# Altium footprint library SAMTEC THD.PcbLib: 161 footprints (part 7 of 12)
Each footprint in its own frame and in the unit in brackets; x right, y up, seen from the top. Pads: shape width x height; smd on the part's side, far side on the other; paste and mask are expansions set on the pad; w line width, h text height; cw(c..) or ccw(c..) is an arc to the next point about the centre after c.
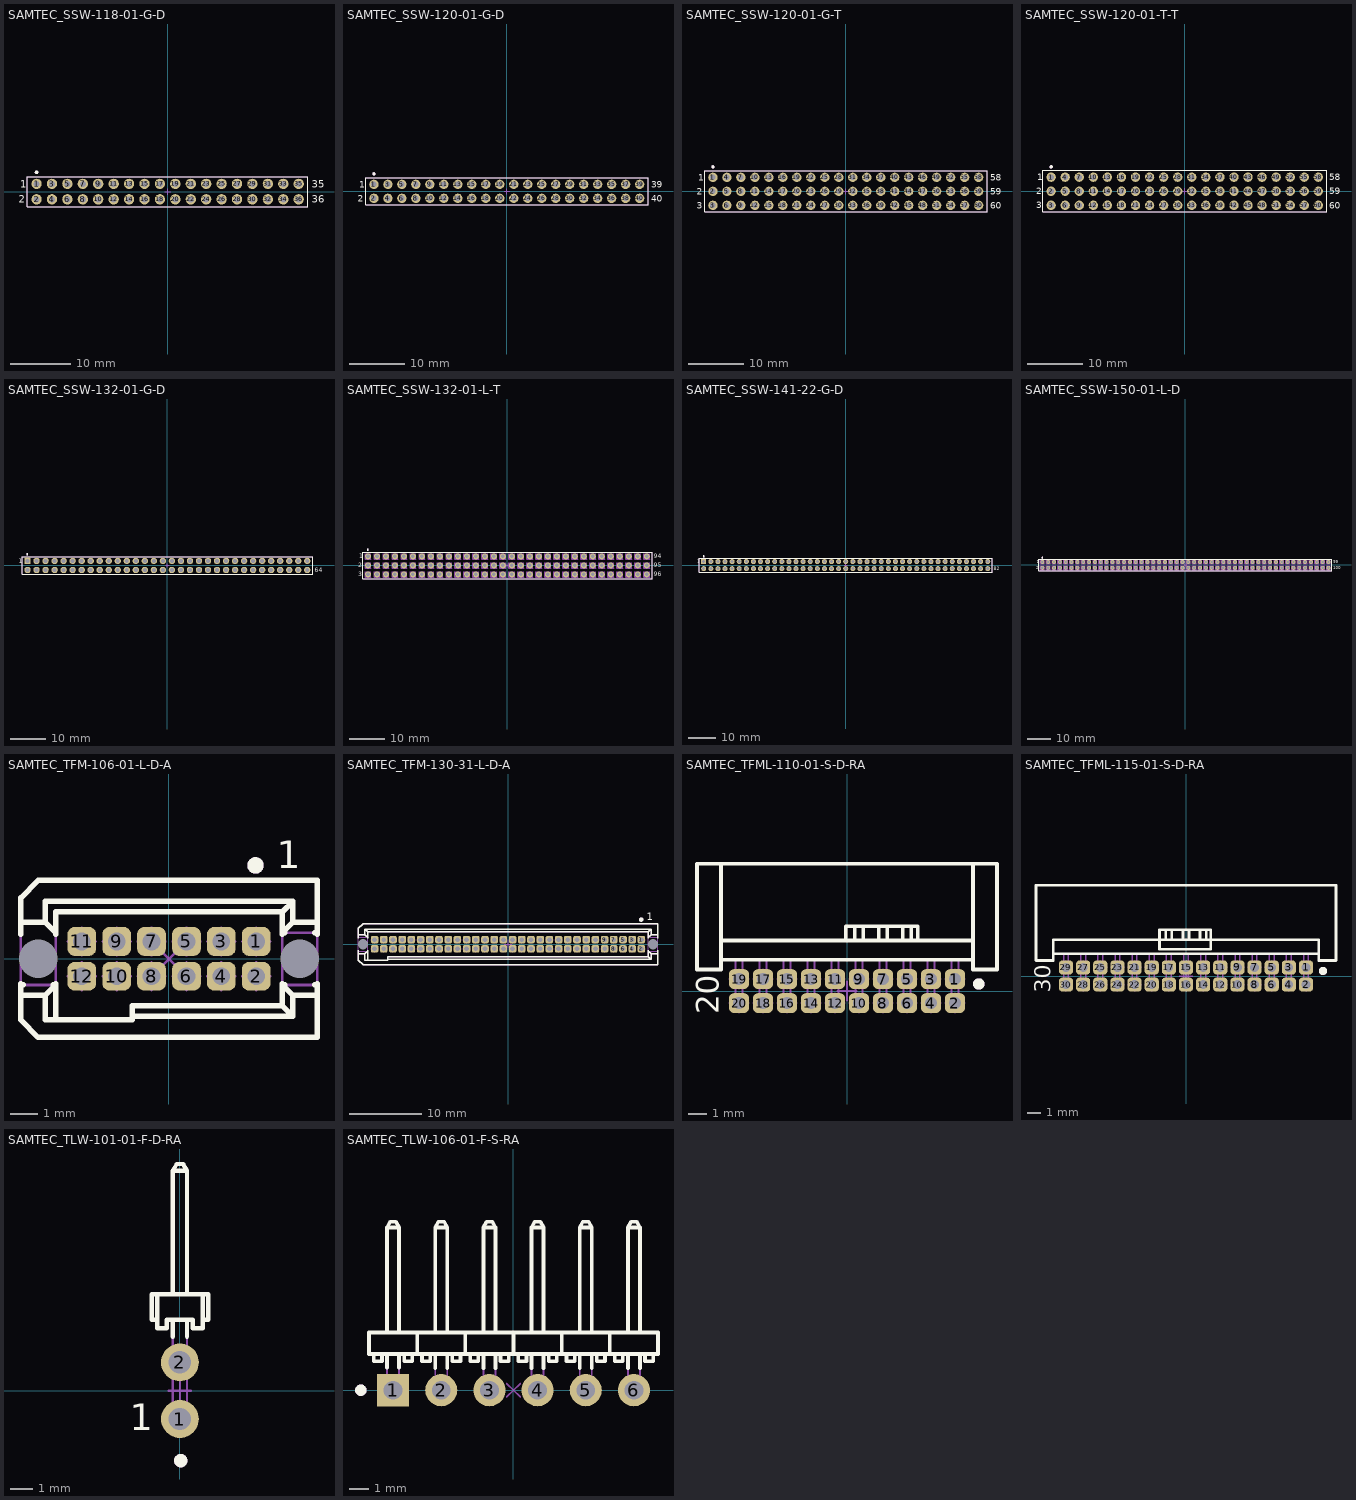
[diagram p6: the footprints below, top view; thin cyan lines are the x and y axes]

## SAMTEC_SSW-118-01-G-D [mm] "36 Contacts, Pitch 2.54mm, Double Row Through Mount Straight Socket (Lead Length 2.64mm)"
height 8.51
pads (36):
  round 1.7 hole 1: 1(-21.59,1.27) 2(-21.59,-1.27) 3(-19.05,1.27) 4(-19.05,-1.27) 5(-16.51,1.27) 6(-16.51,-1.27) 7(-13.97,1.27) 8(-13.97,-1.27) 9(-11.43,1.27) 10(-11.43,-1.27) 11(-8.89,1.27) 12(-8.89,-1.27) 13(-6.35,1.27) 14(-6.35,-1.27) 15(-3.81,1.27) 16(-3.81,-1.27) 17(-1.27,1.27) 18(-1.27,-1.27) 19(1.27,1.27) 20(1.27,-1.27) 21(3.81,1.27) 22(3.81,-1.27) 23(6.35,1.27) 24(6.35,-1.27) 25(8.89,1.27) 26(8.89,-1.27) 27(11.43,1.27) 28(11.43,-1.27) 29(13.97,1.27) 30(13.97,-1.27) 31(16.51,1.27) 32(16.51,-1.27) 33(19.05,1.27) 34(19.05,-1.27) 35(21.59,1.27) 36(21.59,-1.27)
Top Overlay:
  circle w0.3: c-21.59,3.177 r0.15
  lines w0.2: -23.114,-2.476 -23.114,2.476 23.114,2.476 23.114,-2.476 -23.114,-2.476
  text "35" at 23.73,0.67 h1.2
  text "36" at 23.73,-1.87 h1.2
  text "2" at -24.48,-1.87 h1.2
  text "1" at -24.28,0.67 h1.2
Mechanical 8:
  lines w0.05: -22.09,-1.27 -21.59,-1.27 ; -22.09,1.27 -21.59,1.27 ; -21.59,-1.77 -21.59,-1.27 ; -21.59,-0.77 -21.59,-1.27 ; -21.59,0.77 -21.59,1.27 ; -21.59,1.77 -21.59,1.27 ; -21.09,-1.27 -21.59,-1.27 ; -21.09,1.27 -21.59,1.27 ; -19.55,-1.27 -19.05,-1.27 ; -19.55,1.27 -19.05,1.27 ; -19.05,-1.77 -19.05,-1.27 ; -19.05,-0.77 -19.05,-1.27 ; -19.05,0.77 -19.05,1.27 ; -19.05,1.77 -19.05,1.27 ; -18.55,-1.27 -19.05,-1.27 ; -18.55,1.27 -19.05,1.27 ; -17.01,-1.27 -16.51,-1.27 ; -17.01,1.27 -16.51,1.27 ; -16.51,-1.77 -16.51,-1.27 ; -16.51,-0.77 -16.51,-1.27 ; -16.51,0.77 -16.51,1.27 ; -16.51,1.77 -16.51,1.27 ; -16.01,-1.27 -16.51,-1.27 ; -16.01,1.27 -16.51,1.27 ; -14.47,-1.27 -13.97,-1.27 ; -14.47,1.27 -13.97,1.27 ; -13.97,-1.77 -13.97,-1.27 ; -13.97,-0.77 -13.97,-1.27 ; -13.97,0.77 -13.97,1.27 ; -13.97,1.77 -13.97,1.27 ; -13.47,-1.27 -13.97,-1.27 ; -13.47,1.27 -13.97,1.27 ; -11.93,-1.27 -11.43,-1.27 ; -11.93,1.27 -11.43,1.27 ; -11.43,-1.77 -11.43,-1.27 ; -11.43,-0.77 -11.43,-1.27 ; -11.43,0.77 -11.43,1.27 ; -11.43,1.77 -11.43,1.27 ; -10.93,-1.27 -11.43,-1.27 ; -10.93,1.27 -11.43,1.27 ; -9.39,-1.27 -8.89,-1.27 ; -9.39,1.27 -8.89,1.27 ; -8.89,-1.77 -8.89,-1.27 ; -8.89,-0.77 -8.89,-1.27 ; -8.89,0.77 -8.89,1.27 ; -8.89,1.77 -8.89,1.27 ; -8.39,-1.27 -8.89,-1.27 ; -8.39,1.27 -8.89,1.27 ; -6.85,-1.27 -6.35,-1.27 ; -6.85,1.27 -6.35,1.27 ; -6.35,-1.77 -6.35,-1.27 ; -6.35,-0.77 -6.35,-1.27 ; -6.35,0.77 -6.35,1.27 ; -6.35,1.77 -6.35,1.27 ; -5.85,-1.27 -6.35,-1.27 ; -5.85,1.27 -6.35,1.27 ; -4.31,-1.27 -3.81,-1.27 ; -4.31,1.27 -3.81,1.27 ; -3.81,-1.77 -3.81,-1.27 ; -3.81,-0.77 -3.81,-1.27 ; -3.81,0.77 -3.81,1.27 ; -3.81,1.77 -3.81,1.27 ; -3.31,-1.27 -3.81,-1.27 ; -3.31,1.27 -3.81,1.27 ; -1.77,-1.27 -1.27,-1.27 ; -1.77,1.27 -1.27,1.27 ; -1.27,-1.77 -1.27,-1.27 ; -1.27,-0.77 -1.27,-1.27 ; -1.27,0.77 -1.27,1.27 ; -1.27,1.77 -1.27,1.27 ; -0.77,-1.27 -1.27,-1.27 ; -0.77,1.27 -1.27,1.27 ; -0.5,0 0,0 ; 0,-0.5 0,0 ; 0,0.5 0,0 ; 0.5,0 0,0 ; 0.77,-1.27 1.27,-1.27 ; 0.77,1.27 1.27,1.27 ; 1.27,-1.77 1.27,-1.27 ; 1.27,-0.77 1.27,-1.27 ; 1.27,0.77 1.27,1.27 ; 1.27,1.77 1.27,1.27 ; 1.77,-1.27 1.27,-1.27 ; 1.77,1.27 1.27,1.27 ; 3.31,-1.27 3.81,-1.27 ; 3.31,1.27 3.81,1.27 ; 3.81,-1.77 3.81,-1.27 ; 3.81,-0.77 3.81,-1.27 ; 3.81,0.77 3.81,1.27 ; 3.81,1.77 3.81,1.27 ; 4.31,-1.27 3.81,-1.27 ; 4.31,1.27 3.81,1.27 ; 5.85,-1.27 6.35,-1.27 ; 5.85,1.27 6.35,1.27 ; 6.35,-1.77 6.35,-1.27 ; 6.35,-0.77 6.35,-1.27 ; 6.35,0.77 6.35,1.27 ; 6.35,1.77 6.35,1.27 ; 6.85,-1.27 6.35,-1.27 ; 6.85,1.27 6.35,1.27 ; 8.39,-1.27 8.89,-1.27 ; 8.39,1.27 8.89,1.27 ; 8.89,-1.77 8.89,-1.27 ; 8.89,-0.77 8.89,-1.27 ; 8.89,0.77 8.89,1.27 ; 8.89,1.77 8.89,1.27 ; 9.39,-1.27 8.89,-1.27 ; 9.39,1.27 8.89,1.27 ; 10.93,-1.27 11.43,-1.27 ; 10.93,1.27 11.43,1.27 ; 11.43,-1.77 11.43,-1.27 ; 11.43,-0.77 11.43,-1.27 ; 11.43,0.77 11.43,1.27 ; 11.43,1.77 11.43,1.27 ; 11.93,-1.27 11.43,-1.27 ; 11.93,1.27 11.43,1.27 ; 13.47,-1.27 13.97,-1.27 ; 13.47,1.27 13.97,1.27 ; 13.97,-1.77 13.97,-1.27 ; 13.97,-0.77 13.97,-1.27 ; 13.97,0.77 13.97,1.27 ; 13.97,1.77 13.97,1.27 ; 14.47,-1.27 13.97,-1.27 ; 14.47,1.27 13.97,1.27 ; 16.01,-1.27 16.51,-1.27 ; 16.01,1.27 16.51,1.27 ; 16.51,-1.77 16.51,-1.27 ; 16.51,-0.77 16.51,-1.27 ; 16.51,0.77 16.51,1.27 ; 16.51,1.77 16.51,1.27 ; 17.01,-1.27 16.51,-1.27 ; 17.01,1.27 16.51,1.27 ; 18.55,-1.27 19.05,-1.27 ; 18.55,1.27 19.05,1.27 ; 19.05,-1.77 19.05,-1.27 ; 19.05,-0.77 19.05,-1.27 ; 19.05,0.77 19.05,1.27 ; 19.05,1.77 19.05,1.27 ; 19.55,-1.27 19.05,-1.27 ; 19.55,1.27 19.05,1.27 ; 21.09,-1.27 21.59,-1.27 ; 21.09,1.27 21.59,1.27 ; 21.59,-1.77 21.59,-1.27 ; 21.59,-0.77 21.59,-1.27 ; 21.59,0.77 21.59,1.27 ; 21.59,1.77 21.59,1.27 ; 22.09,-1.27 21.59,-1.27 ; 22.09,1.27 21.59,1.27
Mechanical 14:
  circle w0.3: c-21.59,3.177 r0.15
  lines w0.1: -23.114,-2.476 -23.114,2.476 23.114,2.476 23.114,-2.476 -23.114,-2.476 ; -21.984,-1.664 -21.984,-0.876 -21.196,-0.876 -21.196,-1.664 -21.984,-1.664 ; -21.984,0.876 -21.984,1.664 -21.196,1.664 -21.196,0.876 -21.984,0.876 ; -19.444,-1.664 -19.444,-0.876 -18.656,-0.876 -18.656,-1.664 -19.444,-1.664 ; -19.444,0.876 -19.444,1.664 -18.656,1.664 -18.656,0.876 -19.444,0.876 ; -16.904,-1.664 -16.904,-0.876 -16.116,-0.876 -16.116,-1.664 -16.904,-1.664 ; -16.904,0.876 -16.904,1.664 -16.116,1.664 -16.116,0.876 -16.904,0.876 ; -14.364,-1.664 -14.364,-0.876 -13.576,-0.876 -13.576,-1.664 -14.364,-1.664 ; -14.364,0.876 -14.364,1.664 -13.576,1.664 -13.576,0.876 -14.364,0.876 ; -11.824,-1.664 -11.824,-0.876 -11.036,-0.876 -11.036,-1.664 -11.824,-1.664 ; -11.824,0.876 -11.824,1.664 -11.036,1.664 -11.036,0.876 -11.824,0.876 ; -9.284,-1.664 -9.284,-0.876 -8.496,-0.876 -8.496,-1.664 -9.284,-1.664 ; -9.284,0.876 -9.284,1.664 -8.496,1.664 -8.496,0.876 -9.284,0.876 ; -6.744,-1.664 -6.744,-0.876 -5.956,-0.876 -5.956,-1.664 -6.744,-1.664 ; -6.744,0.876 -6.744,1.664 -5.956,1.664 -5.956,0.876 -6.744,0.876 ; -4.204,-1.664 -4.204,-0.876 -3.416,-0.876 -3.416,-1.664 -4.204,-1.664 ; -4.204,0.876 -4.204,1.664 -3.416,1.664 -3.416,0.876 -4.204,0.876 ; -1.664,-1.664 -1.664,-0.876 -0.876,-0.876 -0.876,-1.664 -1.664,-1.664 ; -1.664,0.876 -1.664,1.664 -0.876,1.664 -0.876,0.876 -1.664,0.876 ; 0.876,-1.664 0.876,-0.876 1.664,-0.876 1.664,-1.664 0.876,-1.664 ; 0.876,0.876 0.876,1.664 1.664,1.664 1.664,0.876 0.876,0.876 ; 3.416,-1.664 3.416,-0.876 4.204,-0.876 4.204,-1.664 3.416,-1.664 ; 3.416,0.876 3.416,1.664 4.204,1.664 4.204,0.876 3.416,0.876 ; 5.956,-1.664 5.956,-0.876 6.744,-0.876 6.744,-1.664 5.956,-1.664 ; 5.956,0.876 5.956,1.664 6.744,1.664 6.744,0.876 5.956,0.876 ; 8.496,-1.664 8.496,-0.876 9.284,-0.876 9.284,-1.664 8.496,-1.664 ; 8.496,0.876 8.496,1.664 9.284,1.664 9.284,0.876 8.496,0.876 ; 11.036,-1.664 11.036,-0.876 11.824,-0.876 11.824,-1.664 11.036,-1.664 ; 11.036,0.876 11.036,1.664 11.824,1.664 11.824,0.876 11.036,0.876 ; 13.576,-1.664 13.576,-0.876 14.364,-0.876 14.364,-1.664 13.576,-1.664 ; 13.576,0.876 13.576,1.664 14.364,1.664 14.364,0.876 13.576,0.876 ; 16.116,-1.664 16.116,-0.876 16.904,-0.876 16.904,-1.664 16.116,-1.664 ; 16.116,0.876 16.116,1.664 16.904,1.664 16.904,0.876 16.116,0.876 ; 18.656,-1.664 18.656,-0.876 19.444,-0.876 19.444,-1.664 18.656,-1.664 ; 18.656,0.876 18.656,1.664 19.444,1.664 19.444,0.876 18.656,0.876 ; 21.196,-1.664 21.196,-0.876 21.984,-0.876 21.984,-1.664 21.196,-1.664 ; 21.196,0.876 21.196,1.664 21.984,1.664 21.984,0.876 21.196,0.876
  text "1" at -24.28,0.67 h1.2
3D body "SAMTEC_SSW-118-01-G-D.stp": height 8.51, standoff -2.64, extent -23.114,-2.476 23.114,2.477

## SAMTEC_SSW-120-01-G-D [mm] "40 Contacts, Pitch 2.54mm, Double Row Through Mount Straight Socket (Lead Length 2.64mm)"
height 8.51
pads (40):
  round 1.7 hole 1: 1(-24.13,1.27) 2(-24.13,-1.27) 3(-21.59,1.27) 4(-21.59,-1.27) 5(-19.05,1.27) 6(-19.05,-1.27) 7(-16.51,1.27) 8(-16.51,-1.27) 9(-13.97,1.27) 10(-13.97,-1.27) 11(-11.43,1.27) 12(-11.43,-1.27) 13(-8.89,1.27) 14(-8.89,-1.27) 15(-6.35,1.27) 16(-6.35,-1.27) 17(-3.81,1.27) 18(-3.81,-1.27) 19(-1.27,1.27) 20(-1.27,-1.27) 21(1.27,1.27) 22(1.27,-1.27) 23(3.81,1.27) 24(3.81,-1.27) 25(6.35,1.27) 26(6.35,-1.27) 27(8.89,1.27) 28(8.89,-1.27) 29(11.43,1.27) 30(11.43,-1.27) 31(13.97,1.27) 32(13.97,-1.27) 33(16.51,1.27) 34(16.51,-1.27) 35(19.05,1.27) 36(19.05,-1.27) 37(21.59,1.27) 38(21.59,-1.27) 39(24.13,1.27) 40(24.13,-1.27)
Top Overlay:
  circle w0.3: c-24.13,3.177 r0.15
  lines w0.2: -25.654,-2.476 25.654,-2.476 25.654,2.476 -25.654,2.476 -25.654,-2.476
  text "39" at 26.27,0.67 h1.2
  text "40" at 26.27,-1.87 h1.2
  text "2" at -27.02,-1.87 h1.2
  text "1" at -26.82,0.67 h1.2
Mechanical 8:
  drawing of 164 lines, arcs and shapes, not listed
Mechanical 14:
  drawing of 165 lines, arcs and shapes, not listed
  text "1" at -26.82,0.67 h1.2
3D body "SAMTEC_SSW-120-01-G-D.stp": height 8.51, standoff -2.64, extent -25.654,-2.476 25.654,2.477

## SAMTEC_SSW-120-01-G-T [mm] "60 Contacts, Pitch 2.54mm, Triple Row Through Mount Straight Socket (Lead Length 2.64mm)"
height 8.51
pads (60):
  round 1.7 hole 1: 1(-24.13,2.54) 2(-24.13,0) 3(-24.13,-2.54) 4(-21.59,2.54) 5(-21.59,0) 6(-21.59,-2.54) 7(-19.05,2.54) 8(-19.05,0) 9(-19.05,-2.54) 10(-16.51,2.54) 11(-16.51,0) 12(-16.51,-2.54) 13(-13.97,2.54) 14(-13.97,0) 15(-13.97,-2.54) 16(-11.43,2.54) 17(-11.43,0) 18(-11.43,-2.54) 19(-8.89,2.54) 20(-8.89,0) 21(-8.89,-2.54) 22(-6.35,2.54) 23(-6.35,0) 24(-6.35,-2.54) 25(-3.81,2.54) 26(-3.81,0) 27(-3.81,-2.54) 28(-1.27,2.54) 29(-1.27,0) 30(-1.27,-2.54) 31(1.27,2.54) 32(1.27,0) 33(1.27,-2.54) 34(3.81,2.54) 35(3.81,0) 36(3.81,-2.54) 37(6.35,2.54) 38(6.35,0) 39(6.35,-2.54) 40(8.89,2.54) 41(8.89,0) 42(8.89,-2.54) 43(11.43,2.54) 44(11.43,0) 45(11.43,-2.54) 46(13.97,2.54) 47(13.97,0) 48(13.97,-2.54) 49(16.51,2.54) 50(16.51,0) 51(16.51,-2.54) 52(19.05,2.54) 53(19.05,0) 54(19.05,-2.54) 55(21.59,2.54) 56(21.59,0) 57(21.59,-2.54) 58(24.13,2.54) 59(24.13,0) 60(24.13,-2.54)
Top Overlay:
  circle w0.3: c-24.13,4.447 r0.15
  lines w0.2: -25.654,-3.746 25.654,-3.746 25.654,3.746 -25.654,3.746 -25.654,-3.746
  text "59" at 26.27,-0.6 h1.2
  text "60" at 26.27,-3.14 h1.2
  text "2" at -27.02,-0.6 h1.2
  text "1" at -26.82,1.94 h1.2
  text "58" at 26.27,1.94 h1.2
  text "3" at -27.02,-3.14 h1.2
Mechanical 8:
  drawing of 244 lines, arcs and shapes, not listed
Mechanical 14:
  drawing of 245 lines, arcs and shapes, not listed
  text "1" at -26.82,1.94 h1.2
3D body "SAMTEC_SSW-120-01-G-T.stp": height 8.51, standoff -2.64, extent -25.654,-3.746 25.654,3.747

## SAMTEC_SSW-120-01-T-T [mm] "60 Contacts - Pitch 2.54mm - Triple Row Through Mount Straight Socket (Lead Length 2.64mm)"
height 8.51
pads (60):
  round 1.7 hole 1: 1(-24.13,2.54) 2(-24.13,0) 3(-24.13,-2.54) 4(-21.59,2.54) 5(-21.59,0) 6(-21.59,-2.54) 7(-19.05,2.54) 8(-19.05,0) 9(-19.05,-2.54) 10(-16.51,2.54) 11(-16.51,0) 12(-16.51,-2.54) 13(-13.97,2.54) 14(-13.97,0) 15(-13.97,-2.54) 16(-11.43,2.54) 17(-11.43,0) 18(-11.43,-2.54) 19(-8.89,2.54) 20(-8.89,0) 21(-8.89,-2.54) 22(-6.35,2.54) 23(-6.35,0) 24(-6.35,-2.54) 25(-3.81,2.54) 26(-3.81,0) 27(-3.81,-2.54) 28(-1.27,2.54) 29(-1.27,0) 30(-1.27,-2.54) 31(1.27,2.54) 32(1.27,0) 33(1.27,-2.54) 34(3.81,2.54) 35(3.81,0) 36(3.81,-2.54) 37(6.35,2.54) 38(6.35,0) 39(6.35,-2.54) 40(8.89,2.54) 41(8.89,0) 42(8.89,-2.54) 43(11.43,2.54) 44(11.43,0) 45(11.43,-2.54) 46(13.97,2.54) 47(13.97,0) 48(13.97,-2.54) 49(16.51,2.54) 50(16.51,0) 51(16.51,-2.54) 52(19.05,2.54) 53(19.05,0) 54(19.05,-2.54) 55(21.59,2.54) 56(21.59,0) 57(21.59,-2.54) 58(24.13,2.54) 59(24.13,0) 60(24.13,-2.54)
Top Overlay:
  circle w0.3: c-24.125,4.405 r0.15
  lines w0.2: -25.654,-3.746 25.654,-3.746 25.654,3.746 -25.654,3.746 -25.654,-3.746
  text "60" at 26.12,-3.12 h1.2
  text "3" at -26.862,-3.113 h1.2
  text "59" at 26.12,-0.58 h1.2
  text "2" at -26.862,-0.573 h1.2
  text "58" at 26.12,1.96 h1.2
  text "1" at -26.612,1.967 h1.2
Mechanical 8:
  drawing of 244 lines, arcs and shapes, not listed
Mechanical 14:
  drawing of 245 lines, arcs and shapes, not listed
  text "60" at 26.12,-3.12 h1.2
  text "3" at -26.862,-3.113 h1.2
  text "59" at 26.12,-0.58 h1.2
  text "2" at -26.862,-0.573 h1.2
  text "58" at 26.12,1.96 h1.2
  text "1" at -26.612,1.967 h1.2
3D body "SAMTEC_SSW-120-01-T-T.stp": height 8.51, standoff -2.64, extent -25.654,-3.746 25.654,3.747

## SAMTEC_SSW-132-01-G-D [mm] "64 Contacts, Pitch 2.54mm - Top Entry, Dual Row, Through Mount Straigh Socket"
height 8.51
pads (64):
  rect 1.8x1.8 hole 1.1: 1(-39.37,1.27)
  round 1.8 hole 1.1: 2(-39.37,-1.27) 3(-36.83,1.27) 4(-36.83,-1.27) 5(-34.29,1.27) 6(-34.29,-1.27) 7(-31.75,1.27) 8(-31.75,-1.27) 9(-29.21,1.27) 10(-29.21,-1.27) 11(-26.67,1.27) 12(-26.67,-1.27) 13(-24.13,1.27) 14(-24.13,-1.27) 15(-21.59,1.27) 16(-21.59,-1.27) 17(-19.05,1.27) 18(-19.05,-1.27) 19(-16.51,1.27) 20(-16.51,-1.27) 21(-13.97,1.27) 22(-13.97,-1.27) 23(-11.43,1.27) 24(-11.43,-1.27) 25(-8.89,1.27) 26(-8.89,-1.27) 27(-6.35,1.27) 28(-6.35,-1.27) 29(-3.81,1.27) 30(-3.81,-1.27) 31(-1.27,1.27) 32(-1.27,-1.27) 33(1.27,1.27) 34(1.27,-1.27) 35(3.81,1.27) 36(3.81,-1.27) 37(6.35,1.27) 38(6.35,-1.27) 39(8.89,1.27) 40(8.89,-1.27) 41(11.43,1.27) 42(11.43,-1.27) 43(13.97,1.27) 44(13.97,-1.27) 45(16.51,1.27) 46(16.51,-1.27) 47(19.05,1.27) 48(19.05,-1.27) 49(21.59,1.27) 50(21.59,-1.27) 51(24.13,1.27) 52(24.13,-1.27) 53(26.67,1.27) 54(26.67,-1.27) 55(29.21,1.27) 56(29.21,-1.27) 57(31.75,1.27) 58(31.75,-1.27) 59(34.29,1.27) 60(34.29,-1.27) 61(36.83,1.27) 62(36.83,-1.27) 63(39.37,1.27) 64(39.37,-1.27)
Top Overlay:
  circle w0.3: c-39.405,3.135 r0.15
  lines w0.2: -40.894,-2.476 40.894,-2.476 40.894,2.476 -40.894,2.476 -40.894,-2.476
  text "64" at 41.47,-1.87 h1.2
  text "1" at -41.77,0.67 h1.2
Mechanical 8:
  lines w0.1: -0.5,0 0,0 ; 0,-0.5 0,0 ; 0,0.5 0,0 ; 0.5,0 0,0
Mechanical 14:
  drawing of 261 lines, arcs and shapes, not listed
  text "64" at 41.47,-1.87 h1.2
  text "1" at -41.77,0.67 h1.2
3D body "SAMTEC_SSW-132-01-G-D.stp": height 8.51, standoff -2.64, extent -40.894,-2.476 40.894,2.477

## SAMTEC_SSW-132-01-L-T [mm] "96 Contacts - Pitch 2.54mm - Triple Row Through Mount Straigh Socket (Lead Length 2.64mm)"
height 8.51
pads (96):
  round 1.7 hole 1: 1(-39.37,2.54) 2(-39.37,0) 3(-39.37,-2.54) 4(-36.83,2.54) 5(-36.83,0) 6(-36.83,-2.54) 7(-34.29,2.54) 8(-34.29,0) 9(-34.29,-2.54) 10(-31.75,2.54) 11(-31.75,0) 12(-31.75,-2.54) 13(-29.21,2.54) 14(-29.21,0) 15(-29.21,-2.54) 16(-26.67,2.54) 17(-26.67,0) 18(-26.67,-2.54) 19(-24.13,2.54) 20(-24.13,0) 21(-24.13,-2.54) 22(-21.59,2.54) 23(-21.59,0) 24(-21.59,-2.54) 25(-19.05,2.54) 26(-19.05,0) 27(-19.05,-2.54) 28(-16.51,2.54) 29(-16.51,0) 30(-16.51,-2.54) 31(-13.97,2.54) 32(-13.97,0) 33(-13.97,-2.54) 34(-11.43,2.54) 35(-11.43,0) 36(-11.43,-2.54) 37(-8.89,2.54) 38(-8.89,0) 39(-8.89,-2.54) 40(-6.35,2.54) 41(-6.35,0) 42(-6.35,-2.54) 43(-3.81,2.54) 44(-3.81,0) 45(-3.81,-2.54) 46(-1.27,2.54) 47(-1.27,0) 48(-1.27,-2.54) 49(1.27,2.54) 50(1.27,0) 51(1.27,-2.54) 52(3.81,2.54) 53(3.81,0) 54(3.81,-2.54) 55(6.35,2.54) 56(6.35,0) 57(6.35,-2.54) 58(8.89,2.54) 59(8.89,0) 60(8.89,-2.54) 61(11.43,2.54) 62(11.43,0) 63(11.43,-2.54) 64(13.97,2.54) 65(13.97,0) 66(13.97,-2.54) 67(16.51,2.54) 68(16.51,0) 69(16.51,-2.54) 70(19.05,2.54) 71(19.05,0) 72(19.05,-2.54) 73(21.59,2.54) 74(21.59,0) 75(21.59,-2.54) 76(24.13,2.54) 77(24.13,0) 78(24.13,-2.54) 79(26.67,2.54) 80(26.67,0) 81(26.67,-2.54) 82(29.21,2.54) 83(29.21,0) 84(29.21,-2.54) 85(31.75,2.54) 86(31.75,0) 87(31.75,-2.54) 88(34.29,2.54) 89(34.29,0) 90(34.29,-2.54) 91(36.83,2.54) 92(36.83,0) 93(36.83,-2.54) 94(39.37,2.54) 95(39.37,0) 96(39.37,-2.54)
Top Overlay:
  circle w0.3: c-39.405,4.405 r0.15
  lines w0.2: -40.894,-3.747 -40.894,3.747 40.894,3.747 40.894,-3.747 -40.894,-3.747
  text "94" at 41.34,1.96 h1.2
  text "95" at 41.34,-0.58 h1.2
  text "3" at -42.192,-3.038 h1.2
  text "2" at -42.192,-0.498 h1.2
  text "96" at 41.34,-3.12 h1.2
  text "1" at -41.892,2.042 h1.2
Mechanical 8:
  drawing of 388 lines, arcs and shapes, not listed
Mechanical 14:
  drawing of 1157 lines, arcs and shapes, not listed
  text "94" at 41.34,1.96 h1.2
  text "95" at 41.34,-0.58 h1.2
  text "3" at -42.192,-3.038 h1.2
  text "2" at -42.192,-0.498 h1.2
  text "96" at 41.34,-3.12 h1.2
  text "1" at -41.892,2.042 h1.2
3D body "SAMTEC_SSW-132-01-L-T.stp": height 8.51, standoff -2.54, extent -40.894,-3.746 40.894,3.747

## SAMTEC_SSW-141-22-G-D [mm] "82 Contacts, Pitch 2.54mm - Top Entry, Dual Row, Through Mount Straigh Socket"
height 8.51
pads (82):
  rect 1.8x1.8 hole 1.1: 1(-50.8,1.27)
  round 1.8 hole 1.1: 2(-50.8,-1.27) 3(-48.26,1.27) 4(-48.26,-1.27) 5(-45.72,1.27) 6(-45.72,-1.27) 7(-43.18,1.27) 8(-43.18,-1.27) 9(-40.64,1.27) 10(-40.64,-1.27) 11(-38.1,1.27) 12(-38.1,-1.27) 13(-35.56,1.27) 14(-35.56,-1.27) 15(-33.02,1.27) 16(-33.02,-1.27) 17(-30.48,1.27) 18(-30.48,-1.27) 19(-27.94,1.27) 20(-27.94,-1.27) 21(-25.4,1.27) 22(-25.4,-1.27) 23(-22.86,1.27) 24(-22.86,-1.27) 25(-20.32,1.27) 26(-20.32,-1.27) 27(-17.78,1.27) 28(-17.78,-1.27) 29(-15.24,1.27) 30(-15.24,-1.27) 31(-12.7,1.27) 32(-12.7,-1.27) 33(-10.16,1.27) 34(-10.16,-1.27) 35(-7.62,1.27) 36(-7.62,-1.27) 37(-5.08,1.27) 38(-5.08,-1.27) 39(-2.54,1.27) 40(-2.54,-1.27) 41(0,1.27) 42(0,-1.27) 43(2.54,1.27) 44(2.54,-1.27) 45(5.08,1.27) 46(5.08,-1.27) 47(7.62,1.27) 48(7.62,-1.27) 49(10.16,1.27) 50(10.16,-1.27) 51(12.7,1.27) 52(12.7,-1.27) 53(15.24,1.27) 54(15.24,-1.27) 55(17.78,1.27) 56(17.78,-1.27) 57(20.32,1.27) 58(20.32,-1.27) 59(22.86,1.27) 60(22.86,-1.27) 61(25.4,1.27) 62(25.4,-1.27) 63(27.94,1.27) 64(27.94,-1.27) 65(30.48,1.27) 66(30.48,-1.27) 67(33.02,1.27) 68(33.02,-1.27) 69(35.56,1.27) 70(35.56,-1.27) 71(38.1,1.27) 72(38.1,-1.27) 73(40.64,1.27) 74(40.64,-1.27) 75(43.18,1.27) 76(43.18,-1.27) 77(45.72,1.27) 78(45.72,-1.27) 79(48.26,1.27) 80(48.26,-1.27) 81(50.8,1.27) 82(50.8,-1.27)
Top Overlay:
  circle w0.3: c-50.835,3.135 r0.15
  lines w0.2: -52.324,-2.476 -52.324,2.476 52.324,2.476 52.324,-2.476 -52.324,-2.476
  text "82" at 52.9,-1.87 h1.2
  text "1" at -53.2,0.67 h1.2
Mechanical 8:
  lines w0.1: -0.5,0 0,0 ; 0,-0.5 0,0 ; 0,0.5 0,0 ; 0.5,0 0,0
Mechanical 14:
  drawing of 333 lines, arcs and shapes, not listed
  text "82" at 52.9,-1.87 h1.2
  text "1" at -53.2,0.67 h1.2
3D body "SAMTEC_SSW-141-22-G-D.stp": height 8.51, standoff -4.93, extent -52.324,-2.476 52.324,2.477
